# Altium footprint library PartsDatabaseV16.1.PcbLib: 145 footprints (part 3 of 10)
Each footprint in its own frame and in the unit in brackets; x right, y up, seen from the top. Pads: shape width x height; smd on the part's side, far side on the other; paste and mask are expansions set on the pad; w line width, h text height; cw(c..) or ccw(c..) is an arc to the next point about the centre after c.
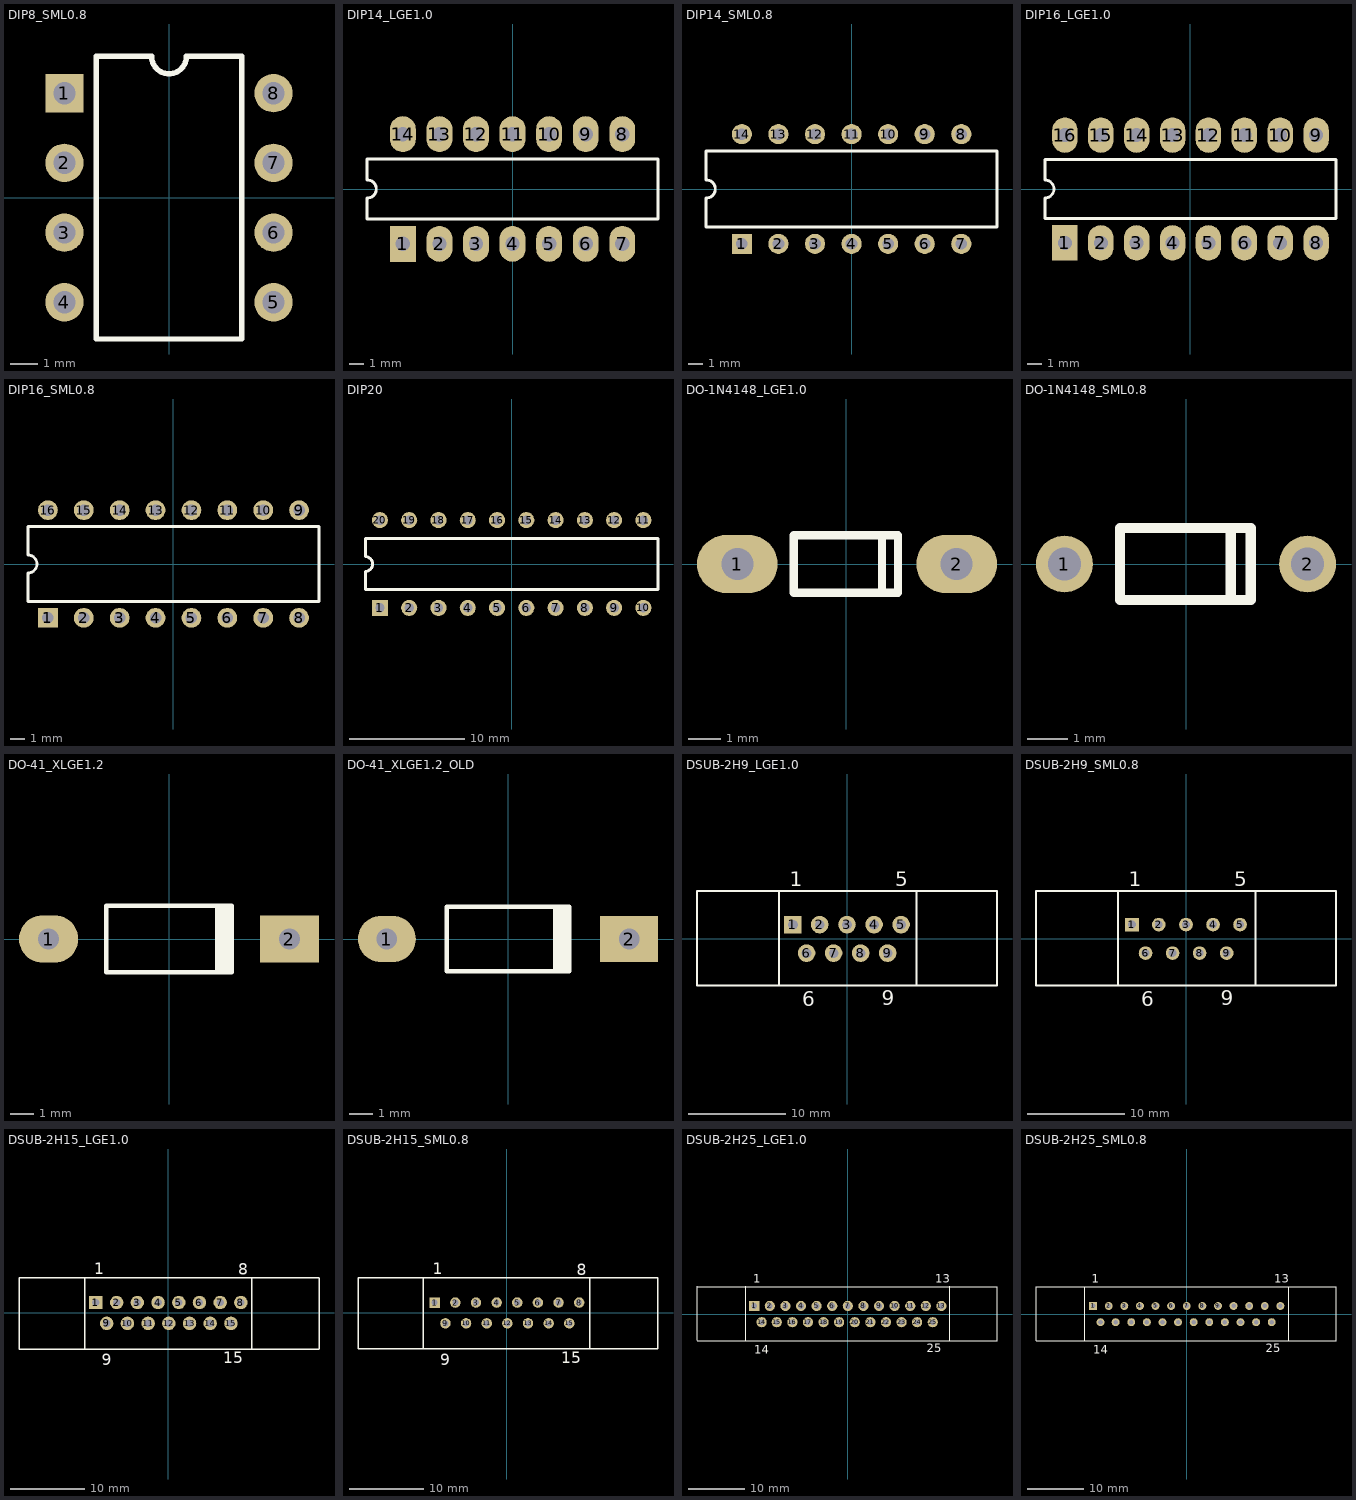
[diagram p2: the footprints below, top view; thin cyan lines are the x and y axes]

## DIP8_SML0.8 [mm] "DIP, 8-Leads, Row Spacing 7.62mm, Pitch 2.54mm, Body 9.91x6.35mm"
height 5.34
pads (8):
  rect 1.4x1.4 hole 0.813: 1(-3.81,3.81)
  round 1.4 hole 0.813: 2(-3.81,1.27) 3(-3.81,-1.27) 4(-3.81,-3.81) 5(3.81,-3.81) 6(3.81,-1.27) 7(3.81,1.27) 8(3.81,3.81)
Top Overlay:
  lines w0.2: -2.65,-5.15 2.65,-5.15 2.65,5.15 0.635,5.15 cw(c0,5.15) -0.635,5.15 -2.65,5.15 -2.65,-5.15
3D body "CircuitWorks-DIP8.step": height 4.19, standoff -2.67, extent -3.937,-5.715 3.937,5.715

## DIP14_LGE1.0 [mm] "DIP; 14 Leads; Row Spacing 7.62 mm; Pitch 2.54 mm"
height 5.1
pads (14):
  rect 1.8x2.5 hole 0.991: 1(-7.62,-3.81)
  oval 1.8x2.5 hole 0.991: 2(-5.08,-3.81) 3(-2.54,-3.81) 4(0,-3.81) 5(2.54,-3.81) 6(5.08,-3.81) 7(7.62,-3.81) 8(7.62,3.81) 9(5.08,3.81) 10(2.54,3.81) 11(0,3.81) 12(-2.54,3.81) 13(-5.08,3.81) 14(-7.62,3.81)
Top Overlay:
  lines w0.2: -10.1,-2.083 10.1,-2.083 10.1,2.083 -10.1,2.083 -10.1,0.635 cw(c-10.1,0) -10.1,-0.635 -10.1,-2.083
3D body "DIP14.step": height 5.08, standoff -2.49, extent -9.721,-3.935 9.779,3.935

## DIP14_SML0.8 [mm] "DIP; 14 Leads; Row Spacing 7.62 mm; Pitch 2.54 mm"
height 5.1
pads (14):
  rect 1.4x1.4 hole 0.813: 1(-7.62,-3.81)
  round 1.4 hole 0.813: 2(-5.08,-3.81) 3(-2.54,-3.81) 4(0,-3.81) 5(2.54,-3.81) 6(5.08,-3.81) 7(7.62,-3.81) 8(7.62,3.81) 9(5.08,3.81) 10(2.54,3.81) 11(0,3.81) 12(-2.54,3.81) 13(-5.08,3.81) 14(-7.62,3.81)
Top Overlay:
  lines w0.2: -10.1,-2.642 -10.1,-0.635 ccw(c-10.1,0) -10.1,0.635 -10.1,2.642 10.1,2.642 10.1,-2.642 -10.1,-2.642
3D body "DIP14.step": height 5.08, standoff -2.49, extent -9.721,-3.933 9.779,3.937

## DIP16_LGE1.0 [mm] "DIP; 16 Leads; Row Spacing 7.62 mm; Pitch 2.54 mm"
height 5.1
pads (16):
  rect 1.8x2.5 hole 0.991: 1(-8.89,-3.81)
  oval 1.8x2.5 hole 0.991: 2(-6.35,-3.81) 3(-3.81,-3.81) 4(-1.27,-3.81) 5(1.27,-3.81) 6(3.81,-3.81) 7(6.35,-3.81) 8(8.89,-3.81) 9(8.89,3.81) 10(6.35,3.81) 11(3.81,3.81) 12(1.27,3.81) 13(-1.27,3.81) 14(-3.81,3.81) 15(-6.35,3.81) 16(-8.89,3.81)
Top Overlay:
  lines w0.2: -10.3,-2.095 -10.3,-0.635 ccw(c-10.3,0) -10.3,0.635 -10.3,2.095 10.3,2.095 10.3,-2.095 -10.3,-2.095
3D body "DIP16.step": height 5.08, standoff -2.49, extent -10.033,-3.937 9.967,3.933

## DIP16_SML0.8 [mm] "DIP; 16 Leads; Row Spacing 7.62 mm; Pitch 2.54 mm"
height 5.1
pads (16):
  rect 1.4x1.4 hole 0.813: 1(-8.89,-3.81)
  round 1.4 hole 0.813: 2(-6.35,-3.81) 3(-3.81,-3.81) 4(-1.27,-3.81) 5(1.27,-3.81) 6(3.81,-3.81) 7(6.35,-3.81) 8(8.89,-3.81) 9(8.89,3.81) 10(6.35,3.81) 11(3.81,3.81) 12(1.27,3.81) 13(-1.27,3.81) 14(-3.81,3.81) 15(-6.35,3.81) 16(-8.89,3.81)
Top Overlay:
  lines w0.2: -10.3,-2.65 -10.3,-0.635 ccw(c-10.3,0) -10.3,0.635 -10.3,2.65 10.3,2.65 10.3,-2.65 -10.3,-2.65
3D body "DIP16.step": height 5.08, standoff -2.49, extent -10,-3.937 10,3.933

## DIP20 [mil]
pads (20):
  rect 55x55 hole 32: 1(-450,-150)
  round 55 hole 32: 2(-350,-150) 3(-250,-150) 4(-150,-150) 5(-50,-150) 6(50,-150) 7(150,-150) 8(250,-150) 9(350,-150) 10(450,-150) 11(450,150) 12(350,150) 13(250,150) 14(150,150) 15(50,150) 16(-50,150) 17(-150,150) 18(-250,150) 19(-350,150) 20(-450,150)
Top Overlay:
  lines w10: -500,-87.5 -500,-25 ccw(c-500,0) -500,25 -500,87.5 500,87.5 500,-87.5 -500,-87.5

## DO-1N4148_LGE1.0 [mm]
pads (2):
  oval 2.5x1.8 hole 0.991: 1(-3.378,0) 2(3.416,0)
Top Overlay:
  lines w0.254: 1.101,-0.889 1.101,0.889 ; -1.628,-0.889 -1.628,0.889 1.597,0.889 1.597,-0.889 0.875,-0.889 -1.628,-0.889
3D body "1n4148.step": height 2.25, standoff -4.25, extent -3.674,-1.029 3.826,0.971

## DO-1N4148_SML0.8 [mm]
pads (2):
  round 1.4 hole 0.813: 1(-3,0) 2(3,0)
Top Overlay:
  lines w0.254: 1.101,-0.889 1.101,0.889 ; -1.628,-0.889 -1.628,0.889 1.597,0.889 1.597,-0.889 0.875,-0.889 -1.628,-0.889
3D body "1n4148.step": height 6.51, standoff 0.01, extent -3.747,-0.991 3.754,1.009

## DO-41_XLGE1.2 [mm] "Diode, Axial; Body 5.2 x 2.7 mm (LxDia. max), Lead Dia. 0.86 mm (max)"
height 2.8
pads (2):
  oval 2.5x2 hole 0.889: 1(-5.08,0)
  rect 2.5x2 hole 0.889: 2(5.08,0)
Top Overlay:
  rectangle: 1.95,-1.4 2.75,1.4
  lines w0.2: 2.65,-1.4 -2.65,-1.4 -2.65,1.4 2.65,1.4
3D body "diode.step": height 2.76, standoff -2.33, extent -5.436,-1.283 5.486,1.283

## DO-41_XLGE1.2_OLD [mm] "Diode, Axial; Body 5.2 x 2.7 mm (LxDia. max), Lead Dia. 0.86 mm (max)"
height 2.8
pads (2):
  oval 2.5x2 hole 0.889: 1(-5.23,0)
  rect 2.5x2 hole 0.889: 2(5.23,0)
Top Overlay:
  rectangle: 1.95,-1.4 2.75,1.4
  lines w0.2: 2.65,-1.4 -2.65,-1.4 -2.65,1.4 2.65,1.4

## DSUB-2H9_LGE1.0 [mm] "Connector; D Subminiature; 9 Position; Pitch 1.37 mm"
height 12.75
pads (9):
  rect 1.8x1.8 hole 0.991: 1(-5.54,1.46)
  round 1.8 hole 0.991: 2(-2.794,1.46) 3(0,1.46) 4(2.77,1.46) 5(5.54,1.46) 6(-4.143,-1.46) 7(-1.373,-1.46) 8(1.397,-1.46) 9(4.167,-1.46)
Top Overlay:
  lines w0.2: -6.985,-4.75 -6.985,4.826 ; 7.112,-4.699 7.112,4.851 ; -15.367,-4.775 15.367,-4.775 15.367,4.889 -15.367,4.889 -15.367,-4.775
  text "6" at -4.572,-6.921 h1.5
  text "9" at 3.556,-6.794 h1.5
  text "5" at 4.953,5.397 h1.5
  text "1" at -5.842,5.397 h1.5

## DSUB-2H9_SML0.8 [mm] "Connector; D Subminiature; 9 Position; Pitch 1.37 mm"
height 12.75
pads (9):
  rect 1.4x1.4 hole 0.813: 1(-5.54,1.46)
  round 1.4 hole 0.813: 2(-2.794,1.46) 3(0,1.46) 4(2.77,1.46) 5(5.54,1.46) 6(-4.143,-1.46) 7(-1.373,-1.46) 8(1.397,-1.46) 9(4.167,-1.46)
Top Overlay:
  lines w0.2: -15.367,-4.763 15.367,-4.763 15.367,4.889 -15.367,4.889 -15.367,-4.75 ; -6.985,-4.699 -6.985,4.826 ; 7.112,-4.635 7.112,4.765
  text "6" at -4.572,-6.921 h1.5
  text "9" at 3.556,-6.794 h1.5
  text "5" at 4.953,5.397 h1.5
  text "1" at -5.842,5.397 h1.5

## DSUB-2H15_LGE1.0 [mm] "Connector; D Subminiature; 15 Position; Pitch 1.37mm"
height 12.75
pads (15):
  rect 1.8x1.8 hole 0.991: 1(-9.695,1.398)
  round 1.8 hole 0.991: 2(-6.925,1.398) 3(-4.155,1.398) 4(-1.385,1.398) 5(1.385,1.398) 6(4.155,1.398) 7(6.925,1.398) 8(9.695,1.398) 9(-8.255,-1.398) 10(-5.485,-1.398) 11(-2.715,-1.398) 12(0.055,-1.398) 13(2.825,-1.398) 14(5.595,-1.398) 15(8.365,-1.398)
Top Overlay:
  lines w0.2: -19.987,-4.827 20.142,-4.827 ; -19.987,-4.826 -19.987,4.698 ; -19.982,4.698 20.142,4.698 ; -11.224,-4.802 -11.224,4.698 ; 11.128,-4.802 11.128,4.698 ; 20.145,-4.827 20.145,4.699
  text "1" at -9.954,5.206 h1.5
  text "8" at 9.35,5.079 h1.5
  text "15" at 7.318,-6.732 h1.5
  text "9" at -8.938,-6.986 h1.5

## DSUB-2H15_SML0.8 [mm] "Connector; D Subminiature; 15 Position; Pitch 1.37 mm"
height 12.75
pads (15):
  rect 1.4x1.4 hole 0.813: 1(-9.695,1.398)
  round 1.4 hole 0.813: 2(-6.925,1.398) 3(-4.155,1.398) 4(-1.385,1.398) 5(1.385,1.398) 6(4.155,1.398) 7(6.925,1.398) 8(9.695,1.398) 9(-8.255,-1.398) 10(-5.485,-1.398) 11(-2.715,-1.398) 12(0.055,-1.398) 13(2.825,-1.398) 14(5.595,-1.398) 15(8.365,-1.398)
Top Overlay:
  lines w0.2: -19.987,-4.827 20.269,-4.827 20.269,4.699 ; -19.987,-4.826 -19.987,4.698 ; -19.982,4.698 20.244,4.698 ; -11.224,-4.802 -11.224,4.698 ; 11.128,-4.802 11.128,4.698
  text "1" at -9.954,5.206 h1.5
  text "8" at 9.35,5.079 h1.5
  text "15" at 7.318,-6.732 h1.5
  text "9" at -8.938,-6.986 h1.5

## DSUB-2H25_LGE1.0 [mm] "Connector; D Subminiature; 25 Position; Pitch 1.37 mm"
height 12.93
pads (25):
  rect 1.8x1.8 hole 0.991: 1(-16.566,1.437)
  round 1.8 hole 0.991: 2(-13.805,1.437) 3(-11.044,1.437) 4(-8.283,1.437) 5(-5.522,1.437) 6(-2.761,1.437) 7(0,1.437) 8(2.761,1.437) 9(5.522,1.437) 10(8.283,1.437) 11(11.044,1.437) 12(13.805,1.437) 13(16.566,1.437) 14(-15.251,-1.436) 15(-12.584,-1.436) 16(-9.818,-1.436) 17(-7.057,-1.436) 18(-4.296,-1.436) 19(-1.535,-1.436) 20(1.226,-1.436) 21(3.987,-1.436) 22(6.748,-1.436) 23(9.509,-1.436) 24(12.27,-1.436) 25(15.031,-1.436)
Top Overlay:
  lines w0.2: -26.695,-4.738 26.405,-4.738 26.405,4.787 ; -26.681,-4.611 -26.681,4.914 ; -26.554,4.835 26.405,4.835 ; -18.045,-4.611 -18.045,4.889 ; 18.023,-4.611 18.023,4.889
  text "1" at -16.775,5.549 h1.5
  text "13" at 15.483,5.549 h1.5
  text "14" at -16.521,-7.024 h1.5
  text "25" at 13.959,-6.77 h1.5

## DSUB-2H25_SML0.8 [mm] "Connector; D Subminiature; 25 Position; Pitch 1.37 mm"
height 12.93
pads (25):
  rect 1.4x1.4 hole 0.813: 1(-16.566,1.437)
  round 1.4 hole 0.813: 2(-13.805,1.437) 3(-11.044,1.437) 4(-8.283,1.437) 5(-5.522,1.437) 6(-2.761,1.437) 7(0,1.437) 8(2.761,1.437) 9(5.522,1.437) 10(8.283,1.437) 11(11.044,1.437) 12(13.805,1.437) 13(16.566,1.437) 14(-15.251,-1.436) 15(-12.584,-1.436) 16(-9.818,-1.436) 17(-7.057,-1.436) 18(-4.296,-1.436) 19(-1.535,-1.436) 20(1.226,-1.436) 21(3.987,-1.436) 22(6.748,-1.436) 23(9.509,-1.436) 24(12.27,-1.436) 25(15.031,-1.436)
Top Overlay:
  lines w0.2: -18.059,-4.674 -18.045,4.826 ; 18.009,-4.674 18.009,4.75 ; -26.67,-4.738 26.405,-4.738 26.405,4.851 -26.67,4.851 -26.67,-4.738
  text "1" at -16.775,5.549 h1.5
  text "13" at 15.483,5.549 h1.5
  text "14" at -16.521,-7.024 h1.5
  text "25" at 13.959,-6.77 h1.5